# Altium footprint library Connector_PinHeader_1.27mm.PcbLib: 278 footprints (part 7 of 18)
Each footprint in its own frame and in the unit in brackets; x right, y up, seen from the top. Pads: shape width x height; smd on the part's side, far side on the other; paste and mask are expansions set on the pad; w line width, h text height; cw(c..) or ccw(c..) is an arc to the next point about the centre after c.
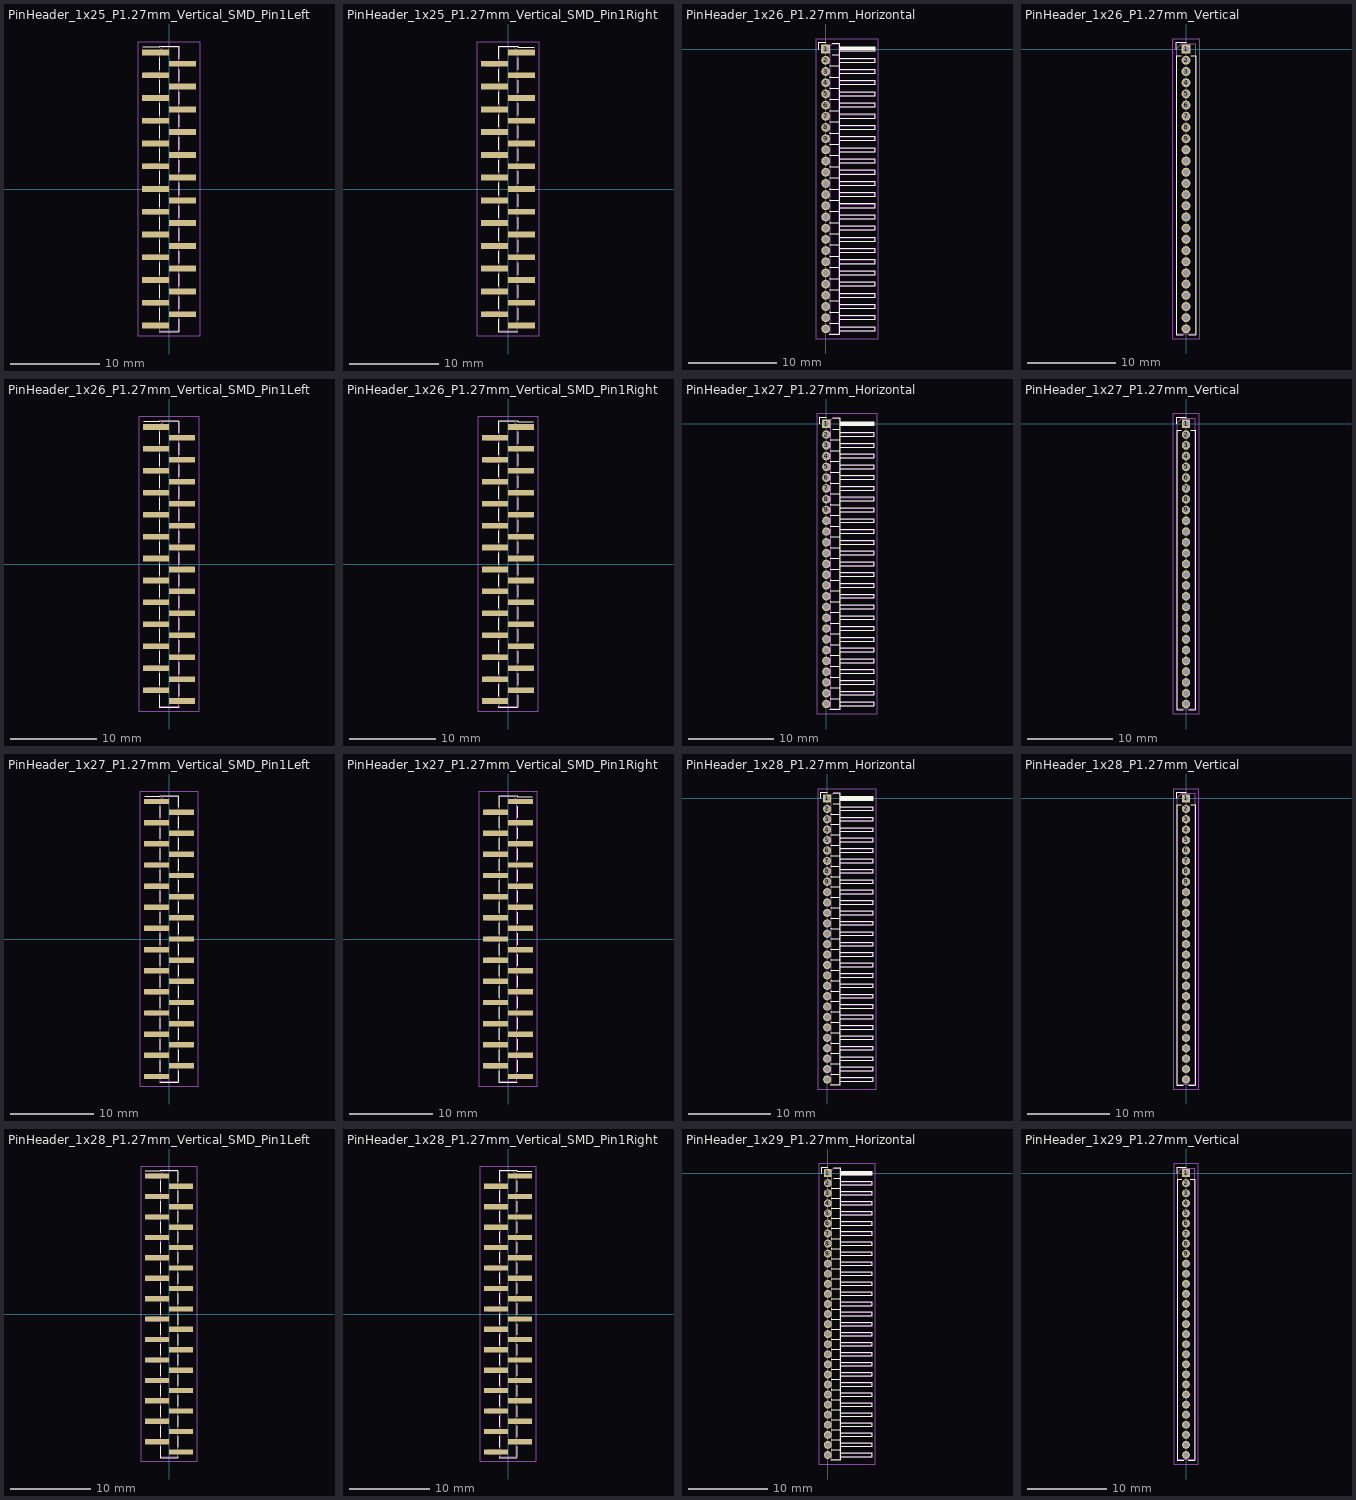
[diagram p6: the footprints below, top view; thin cyan lines are the x and y axes]

## PinHeader_1x25_P1.27mm_Vertical_SMD_Pin1Left [mm]
pads (25):
  rect 3x0.65 smd: 1(-1.5,15.24) 2(1.5,13.97) 3(-1.5,12.7) 4(1.5,11.43) 5(-1.5,10.16) 6(1.5,8.89) 7(-1.5,7.62) 8(1.5,6.35) 9(-1.5,5.08) 10(1.5,3.81) 11(-1.5,2.54) 12(1.5,1.27) 13(-1.5,0) 14(1.5,-1.27) 15(-1.5,-2.54) 16(1.5,-3.81) 17(-1.5,-5.08) 18(1.5,-6.35) 19(-1.5,-7.62) 20(1.5,-8.89) 21(-1.5,-10.16) 22(1.5,-11.43) 23(-1.5,-12.7) 24(1.5,-13.97) 25(-1.5,-15.24)
F.SilkS:
  lines w0.12: -2.94,15.825 -1.11,15.825 -1.11,15.935 1.11,15.935 ; -1.11,-15.935 1.11,-15.935 1.11,-15.825 ; -1.11,-14.655 -1.11,-13.285 ; -1.11,-12.115 -1.11,-10.745 ; -1.11,-9.575 -1.11,-8.205 ; -1.11,-7.035 -1.11,-5.665 ; -1.11,-4.495 -1.11,-3.125 ; -1.11,-1.955 -1.11,-0.585 ; -1.11,0.585 -1.11,1.955 ; -1.11,3.125 -1.11,4.495 ; -1.11,5.665 -1.11,7.035 ; -1.11,8.205 -1.11,9.575 ; -1.11,10.745 -1.11,12.115 ; -1.11,13.285 -1.11,14.655 ; 1.11,-15.925 1.11,-14.555 ; 1.11,-13.385 1.11,-12.015 ; 1.11,-10.845 1.11,-9.475 ; 1.11,-8.305 1.11,-6.935 ; 1.11,-5.765 1.11,-4.395 ; 1.11,-3.225 1.11,-1.855 ; 1.11,-0.685 1.11,0.685 ; 1.11,1.855 1.11,3.225 ; 1.11,4.395 1.11,5.765 ; 1.11,6.935 1.11,8.305 ; 1.11,9.475 1.11,10.845 ; 1.11,12.015 1.11,13.385 ; 1.11,14.555 1.11,15.925
F.CrtYd:
  lines w0.05: -3.5,-16.4 3.5,-16.4 3.5,16.4 -3.5,16.4 -3.5,-16.4
F.Fab:
  lines w0.1: -1.05,-15.44 -2.5,-15.44 -2.5,-15.04 -1.05,-15.04 ; -1.05,-12.9 -2.5,-12.9 -2.5,-12.5 -1.05,-12.5 ; -1.05,-10.36 -2.5,-10.36 -2.5,-9.96 -1.05,-9.96 ; -1.05,-7.82 -2.5,-7.82 -2.5,-7.42 -1.05,-7.42 ; -1.05,-5.28 -2.5,-5.28 -2.5,-4.88 -1.05,-4.88 ; -1.05,-2.74 -2.5,-2.74 -2.5,-2.34 -1.05,-2.34 ; -1.05,-0.2 -2.5,-0.2 -2.5,0.2 -1.05,0.2 ; -1.05,2.34 -2.5,2.34 -2.5,2.74 -1.05,2.74 ; -1.05,4.88 -2.5,4.88 -2.5,5.28 -1.05,5.28 ; -1.05,7.42 -2.5,7.42 -2.5,7.82 -1.05,7.82 ; -1.05,9.96 -2.5,9.96 -2.5,10.36 -1.05,10.36 ; -1.05,12.5 -2.5,12.5 -2.5,12.9 -1.05,12.9 ; -1.05,15.04 -2.5,15.04 -2.5,15.44 -1.05,15.44 ; 1.05,-14.17 2.5,-14.17 2.5,-13.77 1.05,-13.77 ; 1.05,-11.63 2.5,-11.63 2.5,-11.23 1.05,-11.23 ; 1.05,-9.09 2.5,-9.09 2.5,-8.69 1.05,-8.69 ; 1.05,-6.55 2.5,-6.55 2.5,-6.15 1.05,-6.15 ; 1.05,-4.01 2.5,-4.01 2.5,-3.61 1.05,-3.61 ; 1.05,-1.47 2.5,-1.47 2.5,-1.07 1.05,-1.07 ; 1.05,1.07 2.5,1.07 2.5,1.47 1.05,1.47 ; 1.05,3.61 2.5,3.61 2.5,4.01 1.05,4.01 ; 1.05,6.15 2.5,6.15 2.5,6.55 1.05,6.55 ; 1.05,8.69 2.5,8.69 2.5,9.09 1.05,9.09 ; 1.05,11.23 2.5,11.23 2.5,11.63 1.05,11.63 ; 1.05,13.77 2.5,13.77 2.5,14.17 1.05,14.17 ; -1.05,15.44 -1.05,-15.875 1.05,-15.875 1.05,15.875 -0.615,15.875 -1.05,15.44
  text "'.Designator'" at 0.84,-4.047 h1

## PinHeader_1x25_P1.27mm_Vertical_SMD_Pin1Right [mm]
pads (25):
  rect 3x0.65 smd: 1(1.5,15.24) 2(-1.5,13.97) 3(1.5,12.7) 4(-1.5,11.43) 5(1.5,10.16) 6(-1.5,8.89) 7(1.5,7.62) 8(-1.5,6.35) 9(1.5,5.08) 10(-1.5,3.81) 11(1.5,2.54) 12(-1.5,1.27) 13(1.5,0) 14(-1.5,-1.27) 15(1.5,-2.54) 16(-1.5,-3.81) 17(1.5,-5.08) 18(-1.5,-6.35) 19(1.5,-7.62) 20(-1.5,-8.89) 21(1.5,-10.16) 22(-1.5,-11.43) 23(1.5,-12.7) 24(-1.5,-13.97) 25(1.5,-15.24)
F.SilkS:
  lines w0.12: -1.11,-15.925 -1.11,-14.555 ; -1.11,-15.825 -1.11,-15.935 1.11,-15.935 ; -1.11,-13.385 -1.11,-12.015 ; -1.11,-10.845 -1.11,-9.475 ; -1.11,-8.305 -1.11,-6.935 ; -1.11,-5.765 -1.11,-4.395 ; -1.11,-3.225 -1.11,-1.855 ; -1.11,-0.685 -1.11,0.685 ; -1.11,1.855 -1.11,3.225 ; -1.11,4.395 -1.11,5.765 ; -1.11,6.935 -1.11,8.305 ; -1.11,9.475 -1.11,10.845 ; -1.11,12.015 -1.11,13.385 ; -1.11,14.555 -1.11,15.925 ; -1.11,15.935 1.11,15.935 1.11,15.825 2.94,15.825 ; 1.11,-14.655 1.11,-13.285 ; 1.11,-12.115 1.11,-10.745 ; 1.11,-9.575 1.11,-8.205 ; 1.11,-7.035 1.11,-5.665 ; 1.11,-4.495 1.11,-3.125 ; 1.11,-1.955 1.11,-0.585 ; 1.11,0.585 1.11,1.955 ; 1.11,3.125 1.11,4.495 ; 1.11,5.665 1.11,7.035 ; 1.11,8.205 1.11,9.575 ; 1.11,10.745 1.11,12.115 ; 1.11,13.285 1.11,14.655
F.CrtYd:
  lines w0.05: -3.5,-16.4 3.5,-16.4 3.5,16.4 -3.5,16.4 -3.5,-16.4
F.Fab:
  lines w0.1: -1.05,-14.17 -2.5,-14.17 -2.5,-13.77 -1.05,-13.77 ; -1.05,-11.63 -2.5,-11.63 -2.5,-11.23 -1.05,-11.23 ; -1.05,-9.09 -2.5,-9.09 -2.5,-8.69 -1.05,-8.69 ; -1.05,-6.55 -2.5,-6.55 -2.5,-6.15 -1.05,-6.15 ; -1.05,-4.01 -2.5,-4.01 -2.5,-3.61 -1.05,-3.61 ; -1.05,-1.47 -2.5,-1.47 -2.5,-1.07 -1.05,-1.07 ; -1.05,1.07 -2.5,1.07 -2.5,1.47 -1.05,1.47 ; -1.05,3.61 -2.5,3.61 -2.5,4.01 -1.05,4.01 ; -1.05,6.15 -2.5,6.15 -2.5,6.55 -1.05,6.55 ; -1.05,8.69 -2.5,8.69 -2.5,9.09 -1.05,9.09 ; -1.05,11.23 -2.5,11.23 -2.5,11.63 -1.05,11.63 ; -1.05,13.77 -2.5,13.77 -2.5,14.17 -1.05,14.17 ; 1.05,-15.44 2.5,-15.44 2.5,-15.04 1.05,-15.04 ; 1.05,-12.9 2.5,-12.9 2.5,-12.5 1.05,-12.5 ; 1.05,-10.36 2.5,-10.36 2.5,-9.96 1.05,-9.96 ; 1.05,-7.82 2.5,-7.82 2.5,-7.42 1.05,-7.42 ; 1.05,-5.28 2.5,-5.28 2.5,-4.88 1.05,-4.88 ; 1.05,-2.74 2.5,-2.74 2.5,-2.34 1.05,-2.34 ; 1.05,-0.2 2.5,-0.2 2.5,0.2 1.05,0.2 ; 1.05,2.34 2.5,2.34 2.5,2.74 1.05,2.74 ; 1.05,4.88 2.5,4.88 2.5,5.28 1.05,5.28 ; 1.05,7.42 2.5,7.42 2.5,7.82 1.05,7.82 ; 1.05,9.96 2.5,9.96 2.5,10.36 1.05,10.36 ; 1.05,12.5 2.5,12.5 2.5,12.9 1.05,12.9 ; 1.05,15.04 2.5,15.04 2.5,15.44 1.05,15.44 ; 1.05,15.44 1.05,-15.875 -1.05,-15.875 -1.05,15.875 0.615,15.875 1.05,15.44
  text "'.Designator'" at 0.84,-4.047 h1

## PinHeader_1x26_P1.27mm_Horizontal [mm]
pads (26):
  rect 1x1 hole 0.65: 1(0,0)
  rrect100% 1x1 hole 0.65: 2(0,-1.27) 3(0,-2.54) 4(0,-3.81) 5(0,-5.08) 6(0,-6.35) 7(0,-7.62) 8(0,-8.89) 9(0,-10.16) 10(0,-11.43) 11(0,-12.7) 12(0,-13.97) 13(0,-15.24) 14(0,-16.51) 15(0,-17.78) 16(0,-19.05) 17(0,-20.32) 18(0,-21.59) 19(0,-22.86) 20(0,-24.13) 21(0,-25.4) 22(0,-26.67) 23(0,-27.94) 24(0,-29.21) 25(0,-30.48) 26(0,-31.75)
F.SilkS:
  lines w0.12: -0.76,0 -0.76,0.76 0,0.76 ; 0.44,-32.37 0.44,-32.445 1.56,-32.445 1.56,0.695 0.76,0.695 ; 0.44,-31.13 0.44,-31.1 ; 0.44,-31.115 1.56,-31.115 ; 0.44,-29.86 0.44,-29.83 ; 0.44,-29.845 1.56,-29.845 ; 0.44,-28.59 0.44,-28.56 ; 0.44,-28.575 1.56,-28.575 ; 0.44,-27.32 0.44,-27.29 ; 0.44,-27.305 1.56,-27.305 ; 0.44,-26.05 0.44,-26.02 ; 0.44,-26.035 1.56,-26.035 ; 0.44,-24.78 0.44,-24.75 ; 0.44,-24.765 1.56,-24.765 ; 0.44,-23.51 0.44,-23.48 ; 0.44,-23.495 1.56,-23.495 ; 0.44,-22.24 0.44,-22.21 ; 0.44,-22.225 1.56,-22.225 ; 0.44,-20.97 0.44,-20.94 ; 0.44,-20.955 1.56,-20.955 ; 0.44,-19.7 0.44,-19.67 ; 0.44,-19.685 1.56,-19.685 ; 0.44,-18.43 0.44,-18.4 ; 0.44,-18.415 1.56,-18.415 ; 0.44,-17.16 0.44,-17.13 ; 0.44,-17.145 1.56,-17.145 ; 0.44,-15.89 0.44,-15.86 ; 0.44,-15.875 1.56,-15.875 ; 0.44,-14.62 0.44,-14.59 ; 0.44,-14.605 1.56,-14.605 ; 0.44,-13.35 0.44,-13.32 ; 0.44,-13.335 1.56,-13.335 ; 0.44,-12.08 0.44,-12.05 ; 0.44,-12.065 1.56,-12.065 ; 0.44,-10.81 0.44,-10.78 ; 0.44,-10.795 1.56,-10.795 ; 0.44,-9.54 0.44,-9.51 ; 0.44,-9.525 1.56,-9.525 ; 0.44,-8.27 0.44,-8.24 ; 0.44,-8.255 1.56,-8.255 ; 0.44,-7 0.44,-6.97 ; 0.44,-6.985 1.56,-6.985 ; 0.44,-5.73 0.44,-5.7 ; 0.44,-5.715 1.56,-5.715 ; 0.44,-4.46 0.44,-4.43 ; 0.44,-4.445 1.56,-4.445 ; 0.44,-3.19 0.44,-3.16 ; 0.44,-3.175 1.56,-3.175 ; 0.44,-1.92 0.44,-1.89 ; 0.44,-1.905 1.56,-1.905 ; 0.76,-0.635 1.56,-0.635 ; 1.56,-32.01 5.56,-32.01 5.56,-31.49 1.56,-31.49 ; 1.56,-30.74 5.56,-30.74 5.56,-30.22 1.56,-30.22 ; 1.56,-29.47 5.56,-29.47 5.56,-28.95 1.56,-28.95 ; 1.56,-28.2 5.56,-28.2 5.56,-27.68 1.56,-27.68 ; 1.56,-26.93 5.56,-26.93 5.56,-26.41 1.56,-26.41 ; 1.56,-25.66 5.56,-25.66 5.56,-25.14 1.56,-25.14 ; 1.56,-24.39 5.56,-24.39 5.56,-23.87 1.56,-23.87 ; 1.56,-23.12 5.56,-23.12 5.56,-22.6 1.56,-22.6 ; 1.56,-21.85 5.56,-21.85 5.56,-21.33 1.56,-21.33 ; 1.56,-20.58 5.56,-20.58 5.56,-20.06 1.56,-20.06 ; 1.56,-19.31 5.56,-19.31 5.56,-18.79 1.56,-18.79 ; 1.56,-18.04 5.56,-18.04 5.56,-17.52 1.56,-17.52 ; 1.56,-16.77 5.56,-16.77 5.56,-16.25 1.56,-16.25 ; 1.56,-15.5 5.56,-15.5 5.56,-14.98 1.56,-14.98 ; 1.56,-14.23 5.56,-14.23 5.56,-13.71 1.56,-13.71 ; 1.56,-12.96 5.56,-12.96 5.56,-12.44 1.56,-12.44 ; 1.56,-11.69 5.56,-11.69 5.56,-11.17 1.56,-11.17 ; 1.56,-10.42 5.56,-10.42 5.56,-9.9 1.56,-9.9 ; 1.56,-9.15 5.56,-9.15 5.56,-8.63 1.56,-8.63 ; 1.56,-7.88 5.56,-7.88 5.56,-7.36 1.56,-7.36 ; 1.56,-6.61 5.56,-6.61 5.56,-6.09 1.56,-6.09 ; 1.56,-5.34 5.56,-5.34 5.56,-4.82 1.56,-4.82 ; 1.56,-4.07 5.56,-4.07 5.56,-3.55 1.56,-3.55 ; 1.56,-2.8 5.56,-2.8 5.56,-2.28 1.56,-2.28 ; 1.56,-1.53 5.56,-1.53 5.56,-1.01 1.56,-1.01 ; 1.56,-0.26 5.56,-0.26 5.56,0.26 1.56,0.26 ; 1.56,-0.16 5.56,-0.16 ; 1.56,-0.04 5.56,-0.04 ; 1.56,0.08 5.56,0.08 ; 1.56,0.2 5.56,0.2
F.CrtYd:
  lines w0.05: -1.15,-32.9 -1.15,1.15 6,1.15 6,-32.9 -1.15,-32.9
F.Fab:
  drawing of 161 lines, arcs and shapes, not listed
  text "'.Designator'" at 1.504,-18.303 h0.6

## PinHeader_1x26_P1.27mm_Vertical [mm]
pads (26):
  rect 1x1 hole 0.65: 1(0,0)
  rrect100% 1x1 hole 0.65: 2(0,-1.27) 3(0,-2.54) 4(0,-3.81) 5(0,-5.08) 6(0,-6.35) 7(0,-7.62) 8(0,-8.89) 9(0,-10.16) 10(0,-11.43) 11(0,-12.7) 12(0,-13.97) 13(0,-15.24) 14(0,-16.51) 15(0,-17.78) 16(0,-19.05) 17(0,-20.32) 18(0,-21.59) 19(0,-22.86) 20(0,-24.13) 21(0,-25.4) 22(0,-26.67) 23(0,-27.94) 24(0,-29.21) 25(0,-30.48) 26(0,-31.75)
F.SilkS:
  lines w0.12: -1.11,0 -1.11,0.76 0,0.76 ; -0.563,-0.76 -1.11,-0.76 -1.11,-32.445 -0.308,-32.445 ; 0.308,-32.445 1.11,-32.445 1.11,-0.76 0.563,-0.76
F.CrtYd:
  lines w0.05: -1.55,-32.9 -1.55,1.15 1.55,1.15 1.55,-32.9 -1.55,-32.9
F.Fab:
  lines w0.1: -1.05,-32.385 1.05,-32.385 1.05,0.635 -0.525,0.635 -1.05,0.11 -1.05,-32.385
  text "'.Designator'" at 0.84,-19.922 h1

## PinHeader_1x26_P1.27mm_Vertical_SMD_Pin1Left [mm]
pads (26):
  rect 3x0.65 smd: 1(-1.5,15.875) 2(1.5,14.605) 3(-1.5,13.335) 4(1.5,12.065) 5(-1.5,10.795) 6(1.5,9.525) 7(-1.5,8.255) 8(1.5,6.985) 9(-1.5,5.715) 10(1.5,4.445) 11(-1.5,3.175) 12(1.5,1.905) 13(-1.5,0.635) 14(1.5,-0.635) 15(-1.5,-1.905) 16(1.5,-3.175) 17(-1.5,-4.445) 18(1.5,-5.715) 19(-1.5,-6.985) 20(1.5,-8.255) 21(-1.5,-9.525) 22(1.5,-10.795) 23(-1.5,-12.065) 24(1.5,-13.335) 25(-1.5,-14.605) 26(1.5,-15.875)
F.SilkS:
  lines w0.12: -2.94,16.46 -1.11,16.46 -1.11,16.57 1.11,16.57 ; -1.11,-16.57 1.11,-16.57 1.11,-16.46 ; -1.11,-16.56 -1.11,-15.19 ; -1.11,-14.02 -1.11,-12.65 ; -1.11,-11.48 -1.11,-10.11 ; -1.11,-8.94 -1.11,-7.57 ; -1.11,-6.4 -1.11,-5.03 ; -1.11,-3.86 -1.11,-2.49 ; -1.11,-1.32 -1.11,0.05 ; -1.11,1.22 -1.11,2.59 ; -1.11,3.76 -1.11,5.13 ; -1.11,6.3 -1.11,7.67 ; -1.11,8.84 -1.11,10.21 ; -1.11,11.38 -1.11,12.75 ; -1.11,13.92 -1.11,15.29 ; 1.11,-15.29 1.11,-13.92 ; 1.11,-12.75 1.11,-11.38 ; 1.11,-10.21 1.11,-8.84 ; 1.11,-7.67 1.11,-6.3 ; 1.11,-5.13 1.11,-3.76 ; 1.11,-2.59 1.11,-1.22 ; 1.11,-0.05 1.11,1.32 ; 1.11,2.49 1.11,3.86 ; 1.11,5.03 1.11,6.4 ; 1.11,7.57 1.11,8.94 ; 1.11,10.11 1.11,11.48 ; 1.11,12.65 1.11,14.02 ; 1.11,15.19 1.11,16.56
F.CrtYd:
  lines w0.05: -3.5,-17.05 3.5,-17.05 3.5,17.05 -3.5,17.05 -3.5,-17.05
F.Fab:
  lines w0.1: -1.05,-14.805 -2.5,-14.805 -2.5,-14.405 -1.05,-14.405 ; -1.05,-12.265 -2.5,-12.265 -2.5,-11.865 -1.05,-11.865 ; -1.05,-9.725 -2.5,-9.725 -2.5,-9.325 -1.05,-9.325 ; -1.05,-7.185 -2.5,-7.185 -2.5,-6.785 -1.05,-6.785 ; -1.05,-4.645 -2.5,-4.645 -2.5,-4.245 -1.05,-4.245 ; -1.05,-2.105 -2.5,-2.105 -2.5,-1.705 -1.05,-1.705 ; -1.05,0.435 -2.5,0.435 -2.5,0.835 -1.05,0.835 ; -1.05,2.975 -2.5,2.975 -2.5,3.375 -1.05,3.375 ; -1.05,5.515 -2.5,5.515 -2.5,5.915 -1.05,5.915 ; -1.05,8.055 -2.5,8.055 -2.5,8.455 -1.05,8.455 ; -1.05,10.595 -2.5,10.595 -2.5,10.995 -1.05,10.995 ; -1.05,13.135 -2.5,13.135 -2.5,13.535 -1.05,13.535 ; -1.05,15.675 -2.5,15.675 -2.5,16.075 -1.05,16.075 ; 1.05,-16.075 2.5,-16.075 2.5,-15.675 1.05,-15.675 ; 1.05,-13.535 2.5,-13.535 2.5,-13.135 1.05,-13.135 ; 1.05,-10.995 2.5,-10.995 2.5,-10.595 1.05,-10.595 ; 1.05,-8.455 2.5,-8.455 2.5,-8.055 1.05,-8.055 ; 1.05,-5.915 2.5,-5.915 2.5,-5.515 1.05,-5.515 ; 1.05,-3.375 2.5,-3.375 2.5,-2.975 1.05,-2.975 ; 1.05,-0.835 2.5,-0.835 2.5,-0.435 1.05,-0.435 ; 1.05,1.705 2.5,1.705 2.5,2.105 1.05,2.105 ; 1.05,4.245 2.5,4.245 2.5,4.645 1.05,4.645 ; 1.05,6.785 2.5,6.785 2.5,7.185 1.05,7.185 ; 1.05,9.325 2.5,9.325 2.5,9.725 1.05,9.725 ; 1.05,11.865 2.5,11.865 2.5,12.265 1.05,12.265 ; 1.05,14.405 2.5,14.405 2.5,14.805 1.05,14.805 ; -1.05,16.075 -0.615,16.51 1.05,16.51 1.05,-16.51 -1.05,-16.51 -1.05,16.075
  text "'.Designator'" at 0.84,-4.047 h1

## PinHeader_1x26_P1.27mm_Vertical_SMD_Pin1Right [mm]
pads (26):
  rect 3x0.65 smd: 1(1.5,15.875) 2(-1.5,14.605) 3(1.5,13.335) 4(-1.5,12.065) 5(1.5,10.795) 6(-1.5,9.525) 7(1.5,8.255) 8(-1.5,6.985) 9(1.5,5.715) 10(-1.5,4.445) 11(1.5,3.175) 12(-1.5,1.905) 13(1.5,0.635) 14(-1.5,-0.635) 15(1.5,-1.905) 16(-1.5,-3.175) 17(1.5,-4.445) 18(-1.5,-5.715) 19(1.5,-6.985) 20(-1.5,-8.255) 21(1.5,-9.525) 22(-1.5,-10.795) 23(1.5,-12.065) 24(-1.5,-13.335) 25(1.5,-14.605) 26(-1.5,-15.875)
F.SilkS:
  lines w0.12: -1.11,-16.46 -1.11,-16.57 1.11,-16.57 ; -1.11,-15.29 -1.11,-13.92 ; -1.11,-12.75 -1.11,-11.38 ; -1.11,-10.21 -1.11,-8.84 ; -1.11,-7.67 -1.11,-6.3 ; -1.11,-5.13 -1.11,-3.76 ; -1.11,-2.59 -1.11,-1.22 ; -1.11,-0.05 -1.11,1.32 ; -1.11,2.49 -1.11,3.86 ; -1.11,5.03 -1.11,6.4 ; -1.11,7.57 -1.11,8.94 ; -1.11,10.11 -1.11,11.48 ; -1.11,12.65 -1.11,14.02 ; -1.11,15.19 -1.11,16.56 ; -1.11,16.57 1.11,16.57 1.11,16.46 2.94,16.46 ; 1.11,-16.56 1.11,-15.19 ; 1.11,-14.02 1.11,-12.65 ; 1.11,-11.48 1.11,-10.11 ; 1.11,-8.94 1.11,-7.57 ; 1.11,-6.4 1.11,-5.03 ; 1.11,-3.86 1.11,-2.49 ; 1.11,-1.32 1.11,0.05 ; 1.11,1.22 1.11,2.59 ; 1.11,3.76 1.11,5.13 ; 1.11,6.3 1.11,7.67 ; 1.11,8.84 1.11,10.21 ; 1.11,11.38 1.11,12.75 ; 1.11,13.92 1.11,15.29
F.CrtYd:
  lines w0.05: -3.5,-17.05 -3.5,17.05 3.5,17.05 3.5,-17.05 -3.5,-17.05
F.Fab:
  lines w0.1: -1.05,-16.075 -2.5,-16.075 -2.5,-15.675 -1.05,-15.675 ; -1.05,-13.535 -2.5,-13.535 -2.5,-13.135 -1.05,-13.135 ; -1.05,-10.995 -2.5,-10.995 -2.5,-10.595 -1.05,-10.595 ; -1.05,-8.455 -2.5,-8.455 -2.5,-8.055 -1.05,-8.055 ; -1.05,-5.915 -2.5,-5.915 -2.5,-5.515 -1.05,-5.515 ; -1.05,-3.375 -2.5,-3.375 -2.5,-2.975 -1.05,-2.975 ; -1.05,-0.835 -2.5,-0.835 -2.5,-0.435 -1.05,-0.435 ; -1.05,1.705 -2.5,1.705 -2.5,2.105 -1.05,2.105 ; -1.05,4.245 -2.5,4.245 -2.5,4.645 -1.05,4.645 ; -1.05,6.785 -2.5,6.785 -2.5,7.185 -1.05,7.185 ; -1.05,9.325 -2.5,9.325 -2.5,9.725 -1.05,9.725 ; -1.05,11.865 -2.5,11.865 -2.5,12.265 -1.05,12.265 ; -1.05,14.405 -2.5,14.405 -2.5,14.805 -1.05,14.805 ; 1.05,-14.805 2.5,-14.805 2.5,-14.405 1.05,-14.405 ; 1.05,-12.265 2.5,-12.265 2.5,-11.865 1.05,-11.865 ; 1.05,-9.725 2.5,-9.725 2.5,-9.325 1.05,-9.325 ; 1.05,-7.185 2.5,-7.185 2.5,-6.785 1.05,-6.785 ; 1.05,-4.645 2.5,-4.645 2.5,-4.245 1.05,-4.245 ; 1.05,-2.105 2.5,-2.105 2.5,-1.705 1.05,-1.705 ; 1.05,0.435 2.5,0.435 2.5,0.835 1.05,0.835 ; 1.05,2.975 2.5,2.975 2.5,3.375 1.05,3.375 ; 1.05,5.515 2.5,5.515 2.5,5.915 1.05,5.915 ; 1.05,8.055 2.5,8.055 2.5,8.455 1.05,8.455 ; 1.05,10.595 2.5,10.595 2.5,10.995 1.05,10.995 ; 1.05,13.135 2.5,13.135 2.5,13.535 1.05,13.535 ; 1.05,15.675 2.5,15.675 2.5,16.075 1.05,16.075 ; 1.05,16.075 0.615,16.51 -1.05,16.51 -1.05,-16.51 1.05,-16.51 1.05,16.075
  text "'.Designator'" at 0.84,-4.047 h1

## PinHeader_1x27_P1.27mm_Horizontal [mm]
pads (27):
  rect 1x1 hole 0.65: 1(0,0)
  rrect100% 1x1 hole 0.65: 2(0,-1.27) 3(0,-2.54) 4(0,-3.81) 5(0,-5.08) 6(0,-6.35) 7(0,-7.62) 8(0,-8.89) 9(0,-10.16) 10(0,-11.43) 11(0,-12.7) 12(0,-13.97) 13(0,-15.24) 14(0,-16.51) 15(0,-17.78) 16(0,-19.05) 17(0,-20.32) 18(0,-21.59) 19(0,-22.86) 20(0,-24.13) 21(0,-25.4) 22(0,-26.67) 23(0,-27.94) 24(0,-29.21) 25(0,-30.48) 26(0,-31.75) 27(0,-33.02)
F.SilkS:
  lines w0.12: -0.76,0 -0.76,0.76 0,0.76 ; 0.44,-33.64 0.44,-33.715 1.56,-33.715 1.56,0.695 0.76,0.695 ; 0.44,-32.4 0.44,-32.37 ; 0.44,-32.385 1.56,-32.385 ; 0.44,-31.13 0.44,-31.1 ; 0.44,-31.115 1.56,-31.115 ; 0.44,-29.86 0.44,-29.83 ; 0.44,-29.845 1.56,-29.845 ; 0.44,-28.59 0.44,-28.56 ; 0.44,-28.575 1.56,-28.575 ; 0.44,-27.32 0.44,-27.29 ; 0.44,-27.305 1.56,-27.305 ; 0.44,-26.05 0.44,-26.02 ; 0.44,-26.035 1.56,-26.035 ; 0.44,-24.78 0.44,-24.75 ; 0.44,-24.765 1.56,-24.765 ; 0.44,-23.51 0.44,-23.48 ; 0.44,-23.495 1.56,-23.495 ; 0.44,-22.24 0.44,-22.21 ; 0.44,-22.225 1.56,-22.225 ; 0.44,-20.97 0.44,-20.94 ; 0.44,-20.955 1.56,-20.955 ; 0.44,-19.7 0.44,-19.67 ; 0.44,-19.685 1.56,-19.685 ; 0.44,-18.43 0.44,-18.4 ; 0.44,-18.415 1.56,-18.415 ; 0.44,-17.16 0.44,-17.13 ; 0.44,-17.145 1.56,-17.145 ; 0.44,-15.89 0.44,-15.86 ; 0.44,-15.875 1.56,-15.875 ; 0.44,-14.62 0.44,-14.59 ; 0.44,-14.605 1.56,-14.605 ; 0.44,-13.35 0.44,-13.32 ; 0.44,-13.335 1.56,-13.335 ; 0.44,-12.08 0.44,-12.05 ; 0.44,-12.065 1.56,-12.065 ; 0.44,-10.81 0.44,-10.78 ; 0.44,-10.795 1.56,-10.795 ; 0.44,-9.54 0.44,-9.51 ; 0.44,-9.525 1.56,-9.525 ; 0.44,-8.27 0.44,-8.24 ; 0.44,-8.255 1.56,-8.255 ; 0.44,-7 0.44,-6.97 ; 0.44,-6.985 1.56,-6.985 ; 0.44,-5.73 0.44,-5.7 ; 0.44,-5.715 1.56,-5.715 ; 0.44,-4.46 0.44,-4.43 ; 0.44,-4.445 1.56,-4.445 ; 0.44,-3.19 0.44,-3.16 ; 0.44,-3.175 1.56,-3.175 ; 0.44,-1.92 0.44,-1.89 ; 0.44,-1.905 1.56,-1.905 ; 0.76,-0.635 1.56,-0.635 ; 1.56,-33.28 5.56,-33.28 5.56,-32.76 1.56,-32.76 ; 1.56,-32.01 5.56,-32.01 5.56,-31.49 1.56,-31.49 ; 1.56,-30.74 5.56,-30.74 5.56,-30.22 1.56,-30.22 ; 1.56,-29.47 5.56,-29.47 5.56,-28.95 1.56,-28.95 ; 1.56,-28.2 5.56,-28.2 5.56,-27.68 1.56,-27.68 ; 1.56,-26.93 5.56,-26.93 5.56,-26.41 1.56,-26.41 ; 1.56,-25.66 5.56,-25.66 5.56,-25.14 1.56,-25.14 ; 1.56,-24.39 5.56,-24.39 5.56,-23.87 1.56,-23.87 ; 1.56,-23.12 5.56,-23.12 5.56,-22.6 1.56,-22.6 ; 1.56,-21.85 5.56,-21.85 5.56,-21.33 1.56,-21.33 ; 1.56,-20.58 5.56,-20.58 5.56,-20.06 1.56,-20.06 ; 1.56,-19.31 5.56,-19.31 5.56,-18.79 1.56,-18.79 ; 1.56,-18.04 5.56,-18.04 5.56,-17.52 1.56,-17.52 ; 1.56,-16.77 5.56,-16.77 5.56,-16.25 1.56,-16.25 ; 1.56,-15.5 5.56,-15.5 5.56,-14.98 1.56,-14.98 ; 1.56,-14.23 5.56,-14.23 5.56,-13.71 1.56,-13.71 ; 1.56,-12.96 5.56,-12.96 5.56,-12.44 1.56,-12.44 ; 1.56,-11.69 5.56,-11.69 5.56,-11.17 1.56,-11.17 ; 1.56,-10.42 5.56,-10.42 5.56,-9.9 1.56,-9.9 ; 1.56,-9.15 5.56,-9.15 5.56,-8.63 1.56,-8.63 ; 1.56,-7.88 5.56,-7.88 5.56,-7.36 1.56,-7.36 ; 1.56,-6.61 5.56,-6.61 5.56,-6.09 1.56,-6.09 ; 1.56,-5.34 5.56,-5.34 5.56,-4.82 1.56,-4.82 ; 1.56,-4.07 5.56,-4.07 5.56,-3.55 1.56,-3.55 ; 1.56,-2.8 5.56,-2.8 5.56,-2.28 1.56,-2.28 ; 1.56,-1.53 5.56,-1.53 5.56,-1.01 1.56,-1.01 ; 1.56,-0.26 5.56,-0.26 5.56,0.26 1.56,0.26 ; 1.56,-0.16 5.56,-0.16 ; 1.56,-0.04 5.56,-0.04 ; 1.56,0.08 5.56,0.08 ; 1.56,0.2 5.56,0.2
F.CrtYd:
  lines w0.05: -1.15,-34.2 6,-34.2 6,1.15 -1.15,1.15 -1.15,-34.2
F.Fab:
  drawing of 167 lines, arcs and shapes, not listed
  text "'.Designator'" at 1.504,-18.938 h0.6

## PinHeader_1x27_P1.27mm_Vertical [mm]
pads (27):
  rect 1x1 hole 0.65: 1(0,0)
  rrect100% 1x1 hole 0.65: 2(0,-1.27) 3(0,-2.54) 4(0,-3.81) 5(0,-5.08) 6(0,-6.35) 7(0,-7.62) 8(0,-8.89) 9(0,-10.16) 10(0,-11.43) 11(0,-12.7) 12(0,-13.97) 13(0,-15.24) 14(0,-16.51) 15(0,-17.78) 16(0,-19.05) 17(0,-20.32) 18(0,-21.59) 19(0,-22.86) 20(0,-24.13) 21(0,-25.4) 22(0,-26.67) 23(0,-27.94) 24(0,-29.21) 25(0,-30.48) 26(0,-31.75) 27(0,-33.02)
F.SilkS:
  lines w0.12: -1.11,0 -1.11,0.76 0,0.76 ; -0.563,-0.76 -1.11,-0.76 -1.11,-33.715 -0.308,-33.715 ; 0.308,-33.715 1.11,-33.715 1.11,-0.76 0.563,-0.76
F.CrtYd:
  lines w0.05: -1.55,-34.2 1.55,-34.2 1.55,1.15 -1.55,1.15 -1.55,-34.2
F.Fab:
  lines w0.1: -1.05,-33.655 -1.05,0.11 -0.525,0.635 1.05,0.635 1.05,-33.655 -1.05,-33.655
  text "'.Designator'" at 0.84,-20.557 h1

## PinHeader_1x27_P1.27mm_Vertical_SMD_Pin1Left [mm]
pads (27):
  rect 3x0.65 smd: 1(-1.5,16.51) 2(1.5,15.24) 3(-1.5,13.97) 4(1.5,12.7) 5(-1.5,11.43) 6(1.5,10.16) 7(-1.5,8.89) 8(1.5,7.62) 9(-1.5,6.35) 10(1.5,5.08) 11(-1.5,3.81) 12(1.5,2.54) 13(-1.5,1.27) 14(1.5,0) 15(-1.5,-1.27) 16(1.5,-2.54) 17(-1.5,-3.81) 18(1.5,-5.08) 19(-1.5,-6.35) 20(1.5,-7.62) 21(-1.5,-8.89) 22(1.5,-10.16) 23(-1.5,-11.43) 24(1.5,-12.7) 25(-1.5,-13.97) 26(1.5,-15.24) 27(-1.5,-16.51)
F.SilkS:
  lines w0.12: -2.94,17.095 -1.11,17.095 -1.11,17.205 1.11,17.205 ; -1.11,-17.205 1.11,-17.205 1.11,-17.095 ; -1.11,-15.925 -1.11,-14.555 ; -1.11,-13.385 -1.11,-12.015 ; -1.11,-10.845 -1.11,-9.475 ; -1.11,-8.305 -1.11,-6.935 ; -1.11,-5.765 -1.11,-4.395 ; -1.11,-3.225 -1.11,-1.855 ; -1.11,-0.685 -1.11,0.685 ; -1.11,1.855 -1.11,3.225 ; -1.11,4.395 -1.11,5.765 ; -1.11,6.935 -1.11,8.305 ; -1.11,9.475 -1.11,10.845 ; -1.11,12.015 -1.11,13.385 ; -1.11,14.555 -1.11,15.925 ; 1.11,-17.195 1.11,-15.825 ; 1.11,-14.655 1.11,-13.285 ; 1.11,-12.115 1.11,-10.745 ; 1.11,-9.575 1.11,-8.205 ; 1.11,-7.035 1.11,-5.665 ; 1.11,-4.495 1.11,-3.125 ; 1.11,-1.955 1.11,-0.585 ; 1.11,0.585 1.11,1.955 ; 1.11,3.125 1.11,4.495 ; 1.11,5.665 1.11,7.035 ; 1.11,8.205 1.11,9.575 ; 1.11,10.745 1.11,12.115 ; 1.11,13.285 1.11,14.655 ; 1.11,15.825 1.11,17.195
F.CrtYd:
  lines w0.05: -3.5,-17.65 3.5,-17.65 3.5,17.65 -3.5,17.65 -3.5,-17.65
F.Fab:
  lines w0.1: -1.05,-16.71 -2.5,-16.71 -2.5,-16.31 -1.05,-16.31 ; -1.05,-14.17 -2.5,-14.17 -2.5,-13.77 -1.05,-13.77 ; -1.05,-11.63 -2.5,-11.63 -2.5,-11.23 -1.05,-11.23 ; -1.05,-9.09 -2.5,-9.09 -2.5,-8.69 -1.05,-8.69 ; -1.05,-6.55 -2.5,-6.55 -2.5,-6.15 -1.05,-6.15 ; -1.05,-4.01 -2.5,-4.01 -2.5,-3.61 -1.05,-3.61 ; -1.05,-1.47 -2.5,-1.47 -2.5,-1.07 -1.05,-1.07 ; -1.05,1.07 -2.5,1.07 -2.5,1.47 -1.05,1.47 ; -1.05,3.61 -2.5,3.61 -2.5,4.01 -1.05,4.01 ; -1.05,6.15 -2.5,6.15 -2.5,6.55 -1.05,6.55 ; -1.05,8.69 -2.5,8.69 -2.5,9.09 -1.05,9.09 ; -1.05,11.23 -2.5,11.23 -2.5,11.63 -1.05,11.63 ; -1.05,13.77 -2.5,13.77 -2.5,14.17 -1.05,14.17 ; -1.05,16.31 -2.5,16.31 -2.5,16.71 -1.05,16.71 ; 1.05,-15.44 2.5,-15.44 2.5,-15.04 1.05,-15.04 ; 1.05,-12.9 2.5,-12.9 2.5,-12.5 1.05,-12.5 ; 1.05,-10.36 2.5,-10.36 2.5,-9.96 1.05,-9.96 ; 1.05,-7.82 2.5,-7.82 2.5,-7.42 1.05,-7.42 ; 1.05,-5.28 2.5,-5.28 2.5,-4.88 1.05,-4.88 ; 1.05,-2.74 2.5,-2.74 2.5,-2.34 1.05,-2.34 ; 1.05,-0.2 2.5,-0.2 2.5,0.2 1.05,0.2 ; 1.05,2.34 2.5,2.34 2.5,2.74 1.05,2.74 ; 1.05,4.88 2.5,4.88 2.5,5.28 1.05,5.28 ; 1.05,7.42 2.5,7.42 2.5,7.82 1.05,7.82 ; 1.05,9.96 2.5,9.96 2.5,10.36 1.05,10.36 ; 1.05,12.5 2.5,12.5 2.5,12.9 1.05,12.9 ; 1.05,15.04 2.5,15.04 2.5,15.44 1.05,15.44 ; -1.05,16.71 -1.05,-17.145 1.05,-17.145 1.05,17.145 -0.615,17.145 -1.05,16.71
  text "'.Designator'" at 0.84,-4.047 h1

## PinHeader_1x27_P1.27mm_Vertical_SMD_Pin1Right [mm]
pads (27):
  rect 3x0.65 smd: 1(1.5,16.51) 2(-1.5,15.24) 3(1.5,13.97) 4(-1.5,12.7) 5(1.5,11.43) 6(-1.5,10.16) 7(1.5,8.89) 8(-1.5,7.62) 9(1.5,6.35) 10(-1.5,5.08) 11(1.5,3.81) 12(-1.5,2.54) 13(1.5,1.27) 14(-1.5,0) 15(1.5,-1.27) 16(-1.5,-2.54) 17(1.5,-3.81) 18(-1.5,-5.08) 19(1.5,-6.35) 20(-1.5,-7.62) 21(1.5,-8.89) 22(-1.5,-10.16) 23(1.5,-11.43) 24(-1.5,-12.7) 25(1.5,-13.97) 26(-1.5,-15.24) 27(1.5,-16.51)
F.SilkS:
  lines w0.12: -1.11,-17.195 -1.11,-15.825 ; -1.11,-17.095 -1.11,-17.205 1.11,-17.205 ; -1.11,-14.655 -1.11,-13.285 ; -1.11,-12.115 -1.11,-10.745 ; -1.11,-9.575 -1.11,-8.205 ; -1.11,-7.035 -1.11,-5.665 ; -1.11,-4.495 -1.11,-3.125 ; -1.11,-1.955 -1.11,-0.585 ; -1.11,0.585 -1.11,1.955 ; -1.11,3.125 -1.11,4.495 ; -1.11,5.665 -1.11,7.035 ; -1.11,8.205 -1.11,9.575 ; -1.11,10.745 -1.11,12.115 ; -1.11,13.285 -1.11,14.655 ; -1.11,15.825 -1.11,17.195 ; -1.11,17.205 1.11,17.205 1.11,17.095 2.94,17.095 ; 1.11,-15.925 1.11,-14.555 ; 1.11,-13.385 1.11,-12.015 ; 1.11,-10.845 1.11,-9.475 ; 1.11,-8.305 1.11,-6.935 ; 1.11,-5.765 1.11,-4.395 ; 1.11,-3.225 1.11,-1.855 ; 1.11,-0.685 1.11,0.685 ; 1.11,1.855 1.11,3.225 ; 1.11,4.395 1.11,5.765 ; 1.11,6.935 1.11,8.305 ; 1.11,9.475 1.11,10.845 ; 1.11,12.015 1.11,13.385 ; 1.11,14.555 1.11,15.925
F.CrtYd:
  lines w0.05: -3.5,-17.65 -3.5,17.65 3.5,17.65 3.5,-17.65 -3.5,-17.65
F.Fab:
  lines w0.1: -1.05,-15.44 -2.5,-15.44 -2.5,-15.04 -1.05,-15.04 ; -1.05,-12.9 -2.5,-12.9 -2.5,-12.5 -1.05,-12.5 ; -1.05,-10.36 -2.5,-10.36 -2.5,-9.96 -1.05,-9.96 ; -1.05,-7.82 -2.5,-7.82 -2.5,-7.42 -1.05,-7.42 ; -1.05,-5.28 -2.5,-5.28 -2.5,-4.88 -1.05,-4.88 ; -1.05,-2.74 -2.5,-2.74 -2.5,-2.34 -1.05,-2.34 ; -1.05,-0.2 -2.5,-0.2 -2.5,0.2 -1.05,0.2 ; -1.05,2.34 -2.5,2.34 -2.5,2.74 -1.05,2.74 ; -1.05,4.88 -2.5,4.88 -2.5,5.28 -1.05,5.28 ; -1.05,7.42 -2.5,7.42 -2.5,7.82 -1.05,7.82 ; -1.05,9.96 -2.5,9.96 -2.5,10.36 -1.05,10.36 ; -1.05,12.5 -2.5,12.5 -2.5,12.9 -1.05,12.9 ; -1.05,15.04 -2.5,15.04 -2.5,15.44 -1.05,15.44 ; 1.05,-16.71 2.5,-16.71 2.5,-16.31 1.05,-16.31 ; 1.05,-14.17 2.5,-14.17 2.5,-13.77 1.05,-13.77 ; 1.05,-11.63 2.5,-11.63 2.5,-11.23 1.05,-11.23 ; 1.05,-9.09 2.5,-9.09 2.5,-8.69 1.05,-8.69 ; 1.05,-6.55 2.5,-6.55 2.5,-6.15 1.05,-6.15 ; 1.05,-4.01 2.5,-4.01 2.5,-3.61 1.05,-3.61 ; 1.05,-1.47 2.5,-1.47 2.5,-1.07 1.05,-1.07 ; 1.05,1.07 2.5,1.07 2.5,1.47 1.05,1.47 ; 1.05,3.61 2.5,3.61 2.5,4.01 1.05,4.01 ; 1.05,6.15 2.5,6.15 2.5,6.55 1.05,6.55 ; 1.05,8.69 2.5,8.69 2.5,9.09 1.05,9.09 ; 1.05,11.23 2.5,11.23 2.5,11.63 1.05,11.63 ; 1.05,13.77 2.5,13.77 2.5,14.17 1.05,14.17 ; 1.05,16.31 2.5,16.31 2.5,16.71 1.05,16.71 ; 1.05,16.71 0.615,17.145 -1.05,17.145 -1.05,-17.145 1.05,-17.145 1.05,16.71
  text "'.Designator'" at 0.84,-4.047 h1

## PinHeader_1x28_P1.27mm_Horizontal [mm]
pads (28):
  rect 1x1 hole 0.65: 1(0,0)
  rrect100% 1x1 hole 0.65: 2(0,-1.27) 3(0,-2.54) 4(0,-3.81) 5(0,-5.08) 6(0,-6.35) 7(0,-7.62) 8(0,-8.89) 9(0,-10.16) 10(0,-11.43) 11(0,-12.7) 12(0,-13.97) 13(0,-15.24) 14(0,-16.51) 15(0,-17.78) 16(0,-19.05) 17(0,-20.32) 18(0,-21.59) 19(0,-22.86) 20(0,-24.13) 21(0,-25.4) 22(0,-26.67) 23(0,-27.94) 24(0,-29.21) 25(0,-30.48) 26(0,-31.75) 27(0,-33.02) 28(0,-34.29)
F.SilkS:
  lines w0.12: -0.76,0 -0.76,0.76 0,0.76 ; 0.44,-34.91 0.44,-34.985 1.56,-34.985 1.56,0.695 0.76,0.695 ; 0.44,-33.67 0.44,-33.64 ; 0.44,-33.655 1.56,-33.655 ; 0.44,-32.4 0.44,-32.37 ; 0.44,-32.385 1.56,-32.385 ; 0.44,-31.13 0.44,-31.1 ; 0.44,-31.115 1.56,-31.115 ; 0.44,-29.86 0.44,-29.83 ; 0.44,-29.845 1.56,-29.845 ; 0.44,-28.59 0.44,-28.56 ; 0.44,-28.575 1.56,-28.575 ; 0.44,-27.32 0.44,-27.29 ; 0.44,-27.305 1.56,-27.305 ; 0.44,-26.05 0.44,-26.02 ; 0.44,-26.035 1.56,-26.035 ; 0.44,-24.78 0.44,-24.75 ; 0.44,-24.765 1.56,-24.765 ; 0.44,-23.51 0.44,-23.48 ; 0.44,-23.495 1.56,-23.495 ; 0.44,-22.24 0.44,-22.21 ; 0.44,-22.225 1.56,-22.225 ; 0.44,-20.97 0.44,-20.94 ; 0.44,-20.955 1.56,-20.955 ; 0.44,-19.7 0.44,-19.67 ; 0.44,-19.685 1.56,-19.685 ; 0.44,-18.43 0.44,-18.4 ; 0.44,-18.415 1.56,-18.415 ; 0.44,-17.16 0.44,-17.13 ; 0.44,-17.145 1.56,-17.145 ; 0.44,-15.89 0.44,-15.86 ; 0.44,-15.875 1.56,-15.875 ; 0.44,-14.62 0.44,-14.59 ; 0.44,-14.605 1.56,-14.605 ; 0.44,-13.35 0.44,-13.32 ; 0.44,-13.335 1.56,-13.335 ; 0.44,-12.08 0.44,-12.05 ; 0.44,-12.065 1.56,-12.065 ; 0.44,-10.81 0.44,-10.78 ; 0.44,-10.795 1.56,-10.795 ; 0.44,-9.54 0.44,-9.51 ; 0.44,-9.525 1.56,-9.525 ; 0.44,-8.27 0.44,-8.24 ; 0.44,-8.255 1.56,-8.255 ; 0.44,-7 0.44,-6.97 ; 0.44,-6.985 1.56,-6.985 ; 0.44,-5.73 0.44,-5.7 ; 0.44,-5.715 1.56,-5.715 ; 0.44,-4.46 0.44,-4.43 ; 0.44,-4.445 1.56,-4.445 ; 0.44,-3.19 0.44,-3.16 ; 0.44,-3.175 1.56,-3.175 ; 0.44,-1.92 0.44,-1.89 ; 0.44,-1.905 1.56,-1.905 ; 0.76,-0.635 1.56,-0.635 ; 1.56,-34.55 5.56,-34.55 5.56,-34.03 1.56,-34.03 ; 1.56,-33.28 5.56,-33.28 5.56,-32.76 1.56,-32.76 ; 1.56,-32.01 5.56,-32.01 5.56,-31.49 1.56,-31.49 ; 1.56,-30.74 5.56,-30.74 5.56,-30.22 1.56,-30.22 ; 1.56,-29.47 5.56,-29.47 5.56,-28.95 1.56,-28.95 ; 1.56,-28.2 5.56,-28.2 5.56,-27.68 1.56,-27.68 ; 1.56,-26.93 5.56,-26.93 5.56,-26.41 1.56,-26.41 ; 1.56,-25.66 5.56,-25.66 5.56,-25.14 1.56,-25.14 ; 1.56,-24.39 5.56,-24.39 5.56,-23.87 1.56,-23.87 ; 1.56,-23.12 5.56,-23.12 5.56,-22.6 1.56,-22.6 ; 1.56,-21.85 5.56,-21.85 5.56,-21.33 1.56,-21.33 ; 1.56,-20.58 5.56,-20.58 5.56,-20.06 1.56,-20.06 ; 1.56,-19.31 5.56,-19.31 5.56,-18.79 1.56,-18.79 ; 1.56,-18.04 5.56,-18.04 5.56,-17.52 1.56,-17.52 ; 1.56,-16.77 5.56,-16.77 5.56,-16.25 1.56,-16.25 ; 1.56,-15.5 5.56,-15.5 5.56,-14.98 1.56,-14.98 ; 1.56,-14.23 5.56,-14.23 5.56,-13.71 1.56,-13.71 ; 1.56,-12.96 5.56,-12.96 5.56,-12.44 1.56,-12.44 ; 1.56,-11.69 5.56,-11.69 5.56,-11.17 1.56,-11.17 ; 1.56,-10.42 5.56,-10.42 5.56,-9.9 1.56,-9.9 ; 1.56,-9.15 5.56,-9.15 5.56,-8.63 1.56,-8.63 ; 1.56,-7.88 5.56,-7.88 5.56,-7.36 1.56,-7.36 ; 1.56,-6.61 5.56,-6.61 5.56,-6.09 1.56,-6.09 ; 1.56,-5.34 5.56,-5.34 5.56,-4.82 1.56,-4.82 ; 1.56,-4.07 5.56,-4.07 5.56,-3.55 1.56,-3.55 ; 1.56,-2.8 5.56,-2.8 5.56,-2.28 1.56,-2.28 ; 1.56,-1.53 5.56,-1.53 5.56,-1.01 1.56,-1.01 ; 1.56,-0.26 5.56,-0.26 5.56,0.26 1.56,0.26 ; 1.56,-0.16 5.56,-0.16 ; 1.56,-0.04 5.56,-0.04 ; 1.56,0.08 5.56,0.08 ; 1.56,0.2 5.56,0.2
F.CrtYd:
  lines w0.05: -1.15,-35.45 6,-35.45 6,1.15 -1.15,1.15 -1.15,-35.45
F.Fab:
  drawing of 173 lines, arcs and shapes, not listed
  text "'.Designator'" at 1.504,-19.573 h0.6

## PinHeader_1x28_P1.27mm_Vertical [mm]
pads (28):
  rect 1x1 hole 0.65: 1(0,0)
  rrect100% 1x1 hole 0.65: 2(0,-1.27) 3(0,-2.54) 4(0,-3.81) 5(0,-5.08) 6(0,-6.35) 7(0,-7.62) 8(0,-8.89) 9(0,-10.16) 10(0,-11.43) 11(0,-12.7) 12(0,-13.97) 13(0,-15.24) 14(0,-16.51) 15(0,-17.78) 16(0,-19.05) 17(0,-20.32) 18(0,-21.59) 19(0,-22.86) 20(0,-24.13) 21(0,-25.4) 22(0,-26.67) 23(0,-27.94) 24(0,-29.21) 25(0,-30.48) 26(0,-31.75) 27(0,-33.02) 28(0,-34.29)
F.SilkS:
  lines w0.12: -1.11,0 -1.11,0.76 0,0.76 ; -0.563,-0.76 -1.11,-0.76 -1.11,-34.985 -0.308,-34.985 ; 0.308,-34.985 1.11,-34.985 1.11,-0.76 0.563,-0.76
F.CrtYd:
  lines w0.05: -1.55,-35.45 -1.55,1.15 1.55,1.15 1.55,-35.45 -1.55,-35.45
F.Fab:
  lines w0.1: -1.05,-34.925 -1.05,0.11 -0.525,0.635 1.05,0.635 1.05,-34.925 -1.05,-34.925
  text "'.Designator'" at 0.84,-21.192 h1

## PinHeader_1x28_P1.27mm_Vertical_SMD_Pin1Left [mm]
pads (28):
  rect 3x0.65 smd: 1(-1.5,17.145) 2(1.5,15.875) 3(-1.5,14.605) 4(1.5,13.335) 5(-1.5,12.065) 6(1.5,10.795) 7(-1.5,9.525) 8(1.5,8.255) 9(-1.5,6.985) 10(1.5,5.715) 11(-1.5,4.445) 12(1.5,3.175) 13(-1.5,1.905) 14(1.5,0.635) 15(-1.5,-0.635) 16(1.5,-1.905) 17(-1.5,-3.175) 18(1.5,-4.445) 19(-1.5,-5.715) 20(1.5,-6.985) 21(-1.5,-8.255) 22(1.5,-9.525) 23(-1.5,-10.795) 24(1.5,-12.065) 25(-1.5,-13.335) 26(1.5,-14.605) 27(-1.5,-15.875) 28(1.5,-17.145)
F.SilkS:
  lines w0.12: -2.94,17.73 -1.11,17.73 -1.11,17.84 1.11,17.84 ; -1.11,-17.84 1.11,-17.84 1.11,-17.73 ; -1.11,-17.83 -1.11,-16.46 ; -1.11,-15.29 -1.11,-13.92 ; -1.11,-12.75 -1.11,-11.38 ; -1.11,-10.21 -1.11,-8.84 ; -1.11,-7.67 -1.11,-6.3 ; -1.11,-5.13 -1.11,-3.76 ; -1.11,-2.59 -1.11,-1.22 ; -1.11,-0.05 -1.11,1.32 ; -1.11,2.49 -1.11,3.86 ; -1.11,5.03 -1.11,6.4 ; -1.11,7.57 -1.11,8.94 ; -1.11,10.11 -1.11,11.48 ; -1.11,12.65 -1.11,14.02 ; -1.11,15.19 -1.11,16.56 ; 1.11,-16.56 1.11,-15.19 ; 1.11,-14.02 1.11,-12.65 ; 1.11,-11.48 1.11,-10.11 ; 1.11,-8.94 1.11,-7.57 ; 1.11,-6.4 1.11,-5.03 ; 1.11,-3.86 1.11,-2.49 ; 1.11,-1.32 1.11,0.05 ; 1.11,1.22 1.11,2.59 ; 1.11,3.76 1.11,5.13 ; 1.11,6.3 1.11,7.67 ; 1.11,8.84 1.11,10.21 ; 1.11,11.38 1.11,12.75 ; 1.11,13.92 1.11,15.29 ; 1.11,16.46 1.11,17.83
F.CrtYd:
  lines w0.05: -3.5,-18.3 -3.5,18.3 3.5,18.3 3.5,-18.3 -3.5,-18.3
F.Fab:
  lines w0.1: -1.05,-16.075 -2.5,-16.075 -2.5,-15.675 -1.05,-15.675 ; -1.05,-13.535 -2.5,-13.535 -2.5,-13.135 -1.05,-13.135 ; -1.05,-10.995 -2.5,-10.995 -2.5,-10.595 -1.05,-10.595 ; -1.05,-8.455 -2.5,-8.455 -2.5,-8.055 -1.05,-8.055 ; -1.05,-5.915 -2.5,-5.915 -2.5,-5.515 -1.05,-5.515 ; -1.05,-3.375 -2.5,-3.375 -2.5,-2.975 -1.05,-2.975 ; -1.05,-0.835 -2.5,-0.835 -2.5,-0.435 -1.05,-0.435 ; -1.05,1.705 -2.5,1.705 -2.5,2.105 -1.05,2.105 ; -1.05,4.245 -2.5,4.245 -2.5,4.645 -1.05,4.645 ; -1.05,6.785 -2.5,6.785 -2.5,7.185 -1.05,7.185 ; -1.05,9.325 -2.5,9.325 -2.5,9.725 -1.05,9.725 ; -1.05,11.865 -2.5,11.865 -2.5,12.265 -1.05,12.265 ; -1.05,14.405 -2.5,14.405 -2.5,14.805 -1.05,14.805 ; -1.05,16.945 -2.5,16.945 -2.5,17.345 -1.05,17.345 ; 1.05,-17.345 2.5,-17.345 2.5,-16.945 1.05,-16.945 ; 1.05,-14.805 2.5,-14.805 2.5,-14.405 1.05,-14.405 ; 1.05,-12.265 2.5,-12.265 2.5,-11.865 1.05,-11.865 ; 1.05,-9.725 2.5,-9.725 2.5,-9.325 1.05,-9.325 ; 1.05,-7.185 2.5,-7.185 2.5,-6.785 1.05,-6.785 ; 1.05,-4.645 2.5,-4.645 2.5,-4.245 1.05,-4.245 ; 1.05,-2.105 2.5,-2.105 2.5,-1.705 1.05,-1.705 ; 1.05,0.435 2.5,0.435 2.5,0.835 1.05,0.835 ; 1.05,2.975 2.5,2.975 2.5,3.375 1.05,3.375 ; 1.05,5.515 2.5,5.515 2.5,5.915 1.05,5.915 ; 1.05,8.055 2.5,8.055 2.5,8.455 1.05,8.455 ; 1.05,10.595 2.5,10.595 2.5,10.995 1.05,10.995 ; 1.05,13.135 2.5,13.135 2.5,13.535 1.05,13.535 ; 1.05,15.675 2.5,15.675 2.5,16.075 1.05,16.075 ; -1.05,17.345 -0.615,17.78 1.05,17.78 1.05,-17.78 -1.05,-17.78 -1.05,17.345
  text "'.Designator'" at 0.84,-4.047 h1

## PinHeader_1x28_P1.27mm_Vertical_SMD_Pin1Right [mm]
pads (28):
  rect 3x0.65 smd: 1(1.5,17.145) 2(-1.5,15.875) 3(1.5,14.605) 4(-1.5,13.335) 5(1.5,12.065) 6(-1.5,10.795) 7(1.5,9.525) 8(-1.5,8.255) 9(1.5,6.985) 10(-1.5,5.715) 11(1.5,4.445) 12(-1.5,3.175) 13(1.5,1.905) 14(-1.5,0.635) 15(1.5,-0.635) 16(-1.5,-1.905) 17(1.5,-3.175) 18(-1.5,-4.445) 19(1.5,-5.715) 20(-1.5,-6.985) 21(1.5,-8.255) 22(-1.5,-9.525) 23(1.5,-10.795) 24(-1.5,-12.065) 25(1.5,-13.335) 26(-1.5,-14.605) 27(1.5,-15.875) 28(-1.5,-17.145)
F.SilkS:
  lines w0.12: -1.11,-17.73 -1.11,-17.84 1.11,-17.84 ; -1.11,-16.56 -1.11,-15.19 ; -1.11,-14.02 -1.11,-12.65 ; -1.11,-11.48 -1.11,-10.11 ; -1.11,-8.94 -1.11,-7.57 ; -1.11,-6.4 -1.11,-5.03 ; -1.11,-3.86 -1.11,-2.49 ; -1.11,-1.32 -1.11,0.05 ; -1.11,1.22 -1.11,2.59 ; -1.11,3.76 -1.11,5.13 ; -1.11,6.3 -1.11,7.67 ; -1.11,8.84 -1.11,10.21 ; -1.11,11.38 -1.11,12.75 ; -1.11,13.92 -1.11,15.29 ; -1.11,16.46 -1.11,17.83 ; -1.11,17.84 1.11,17.84 1.11,17.73 2.94,17.73 ; 1.11,-17.83 1.11,-16.46 ; 1.11,-15.29 1.11,-13.92 ; 1.11,-12.75 1.11,-11.38 ; 1.11,-10.21 1.11,-8.84 ; 1.11,-7.67 1.11,-6.3 ; 1.11,-5.13 1.11,-3.76 ; 1.11,-2.59 1.11,-1.22 ; 1.11,-0.05 1.11,1.32 ; 1.11,2.49 1.11,3.86 ; 1.11,5.03 1.11,6.4 ; 1.11,7.57 1.11,8.94 ; 1.11,10.11 1.11,11.48 ; 1.11,12.65 1.11,14.02 ; 1.11,15.19 1.11,16.56
F.CrtYd:
  lines w0.05: -3.5,-18.3 3.5,-18.3 3.5,18.3 -3.5,18.3 -3.5,-18.3
F.Fab:
  lines w0.1: -1.05,-17.345 -2.5,-17.345 -2.5,-16.945 -1.05,-16.945 ; -1.05,-14.805 -2.5,-14.805 -2.5,-14.405 -1.05,-14.405 ; -1.05,-12.265 -2.5,-12.265 -2.5,-11.865 -1.05,-11.865 ; -1.05,-9.725 -2.5,-9.725 -2.5,-9.325 -1.05,-9.325 ; -1.05,-7.185 -2.5,-7.185 -2.5,-6.785 -1.05,-6.785 ; -1.05,-4.645 -2.5,-4.645 -2.5,-4.245 -1.05,-4.245 ; -1.05,-2.105 -2.5,-2.105 -2.5,-1.705 -1.05,-1.705 ; -1.05,0.435 -2.5,0.435 -2.5,0.835 -1.05,0.835 ; -1.05,2.975 -2.5,2.975 -2.5,3.375 -1.05,3.375 ; -1.05,5.515 -2.5,5.515 -2.5,5.915 -1.05,5.915 ; -1.05,8.055 -2.5,8.055 -2.5,8.455 -1.05,8.455 ; -1.05,10.595 -2.5,10.595 -2.5,10.995 -1.05,10.995 ; -1.05,13.135 -2.5,13.135 -2.5,13.535 -1.05,13.535 ; -1.05,15.675 -2.5,15.675 -2.5,16.075 -1.05,16.075 ; 1.05,-16.075 2.5,-16.075 2.5,-15.675 1.05,-15.675 ; 1.05,-13.535 2.5,-13.535 2.5,-13.135 1.05,-13.135 ; 1.05,-10.995 2.5,-10.995 2.5,-10.595 1.05,-10.595 ; 1.05,-8.455 2.5,-8.455 2.5,-8.055 1.05,-8.055 ; 1.05,-5.915 2.5,-5.915 2.5,-5.515 1.05,-5.515 ; 1.05,-3.375 2.5,-3.375 2.5,-2.975 1.05,-2.975 ; 1.05,-0.835 2.5,-0.835 2.5,-0.435 1.05,-0.435 ; 1.05,1.705 2.5,1.705 2.5,2.105 1.05,2.105 ; 1.05,4.245 2.5,4.245 2.5,4.645 1.05,4.645 ; 1.05,6.785 2.5,6.785 2.5,7.185 1.05,7.185 ; 1.05,9.325 2.5,9.325 2.5,9.725 1.05,9.725 ; 1.05,11.865 2.5,11.865 2.5,12.265 1.05,12.265 ; 1.05,14.405 2.5,14.405 2.5,14.805 1.05,14.805 ; 1.05,16.945 2.5,16.945 2.5,17.345 1.05,17.345 ; 1.05,17.345 0.615,17.78 -1.05,17.78 -1.05,-17.78 1.05,-17.78 1.05,17.345
  text "'.Designator'" at 0.84,-4.047 h1

## PinHeader_1x29_P1.27mm_Horizontal [mm]
pads (29):
  rect 1x1 hole 0.65: 1(0,0)
  rrect100% 1x1 hole 0.65: 2(0,-1.27) 3(0,-2.54) 4(0,-3.81) 5(0,-5.08) 6(0,-6.35) 7(0,-7.62) 8(0,-8.89) 9(0,-10.16) 10(0,-11.43) 11(0,-12.7) 12(0,-13.97) 13(0,-15.24) 14(0,-16.51) 15(0,-17.78) 16(0,-19.05) 17(0,-20.32) 18(0,-21.59) 19(0,-22.86) 20(0,-24.13) 21(0,-25.4) 22(0,-26.67) 23(0,-27.94) 24(0,-29.21) 25(0,-30.48) 26(0,-31.75) 27(0,-33.02) 28(0,-34.29) 29(0,-35.56)
F.SilkS:
  drawing of 152 lines, arcs and shapes, not listed
F.CrtYd:
  lines w0.05: -1.15,-36.7 6,-36.7 6,1.15 -1.15,1.15 -1.15,-36.7
F.Fab:
  drawing of 179 lines, arcs and shapes, not listed
  text "'.Designator'" at 1.504,-20.208 h0.6

## PinHeader_1x29_P1.27mm_Vertical [mm]
pads (29):
  rect 1x1 hole 0.65: 1(0,0)
  rrect100% 1x1 hole 0.65: 2(0,-1.27) 3(0,-2.54) 4(0,-3.81) 5(0,-5.08) 6(0,-6.35) 7(0,-7.62) 8(0,-8.89) 9(0,-10.16) 10(0,-11.43) 11(0,-12.7) 12(0,-13.97) 13(0,-15.24) 14(0,-16.51) 15(0,-17.78) 16(0,-19.05) 17(0,-20.32) 18(0,-21.59) 19(0,-22.86) 20(0,-24.13) 21(0,-25.4) 22(0,-26.67) 23(0,-27.94) 24(0,-29.21) 25(0,-30.48) 26(0,-31.75) 27(0,-33.02) 28(0,-34.29) 29(0,-35.56)
F.SilkS:
  lines w0.12: -1.11,0 -1.11,0.76 0,0.76 ; -0.563,-0.76 -1.11,-0.76 -1.11,-36.255 -0.308,-36.255 ; 0.308,-36.255 1.11,-36.255 1.11,-0.76 0.563,-0.76
F.CrtYd:
  lines w0.05: -1.55,-36.7 1.55,-36.7 1.55,1.15 -1.55,1.15 -1.55,-36.7
F.Fab:
  lines w0.1: -1.05,-36.195 1.05,-36.195 1.05,0.635 -0.525,0.635 -1.05,0.11 -1.05,-36.195
  text "'.Designator'" at 0.84,-21.827 h1